# Altium footprint library eLIB.PcbLib: 206 footprints (part 9 of 13)
Each footprint in its own frame and in the unit in brackets; x right, y up, seen from the top. Pads: shape width x height; smd on the part's side, far side on the other; paste and mask are expansions set on the pad; w line width, h text height; cw(c..) or ccw(c..) is an arc to the next point about the centre after c.
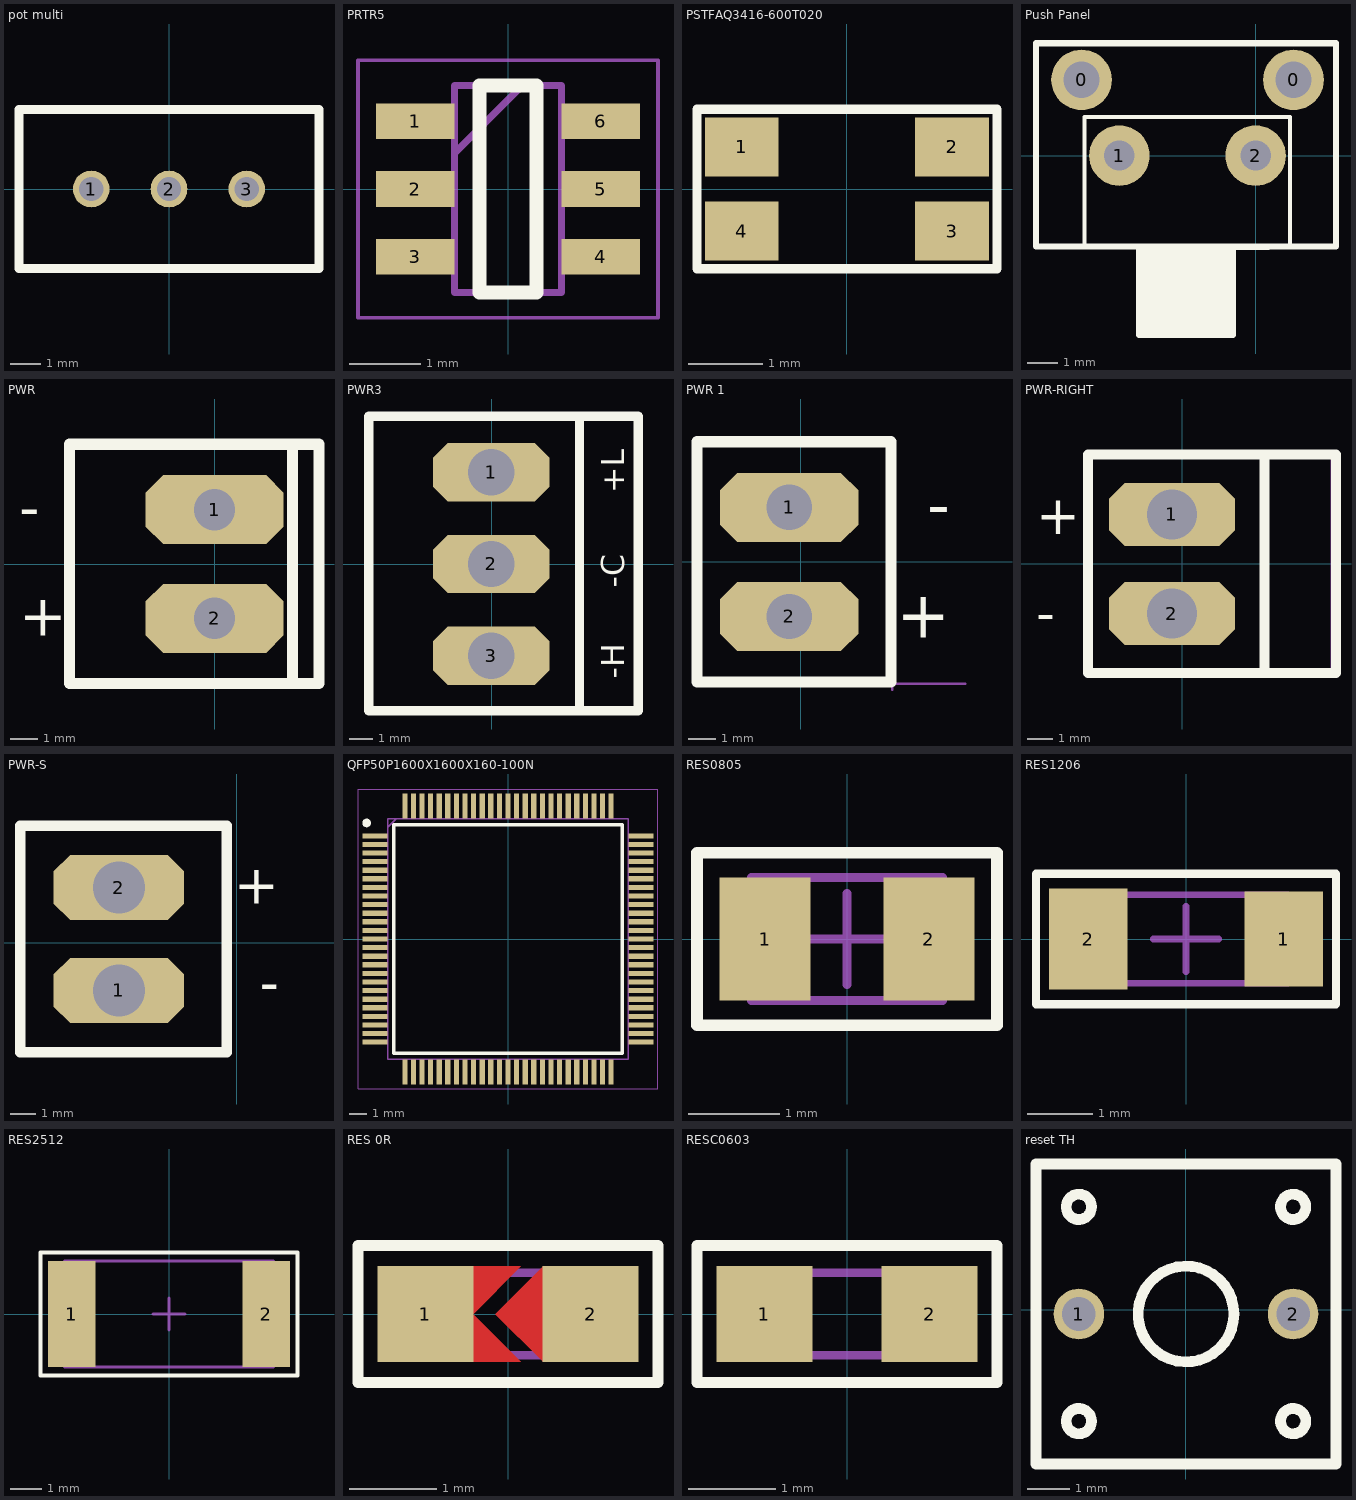
[diagram p8: the footprints below, top view; thin cyan lines are the x and y axes]

## pot multi [mm] "multiturn potentiometer"
pads (3):
  round 1.2 hole 0.8: 1(-2.54,0) 2(0,0) 3(2.54,0)
Top Overlay:
  lines w0.3: -4.9,-2.6 -4.9,2.6 0.19,2.6 4.9,2.6 4.9,-2.6 -0.19,-2.6 -4.9,-2.6
3D body "Trimpot_3296W.STEP": height 11.55, standoff -2.6, extent -4.765,-2.415 4.765,2.415

## PRTR5 [mm] "ESD Protection"
pads (6):
  rect 1.1x0.5 smd: 1(-1.3,0.95) 2(-1.3,0) 3(-1.3,-0.95) 4(1.3,-0.95) 5(1.3,0) 6(1.3,0.95)
Top Overlay:
  lines w0.2: -0.4,-1.45 -0.4,1.45 0.4,1.45 0.4,-1.45 -0.4,-1.45
Mechanical 13:
  lines w0.1: -0.75,0.5 0.2,1.45 ; -0.75,-1.45 -0.75,1.45 0.75,1.45 0.75,-1.45 -0.75,-1.45
Mechanical 15:
  lines w0.05: -2.1,-1.8 -2.1,1.8 2.1,1.8 2.1,-1.8 -2.1,-1.8
3D body "PRTR5V0U4D.stp": height 1, standoff 0, extent -1.375,-1.45 1.375,1.45

## PSTFAQ3416-600T020 [mm] "trans pulse"
pads (4):
  rect 1x0.8 smd: 1(-1.424,0.571) 2(1.424,0.571) 3(1.424,-0.571) 4(-1.424,-0.571)
Top Overlay:
  lines w0.127: -2.03,-1.079 2.034,-1.079 2.034,1.08 -2.03,1.08 -2.03,-1.079

## Push Panel [mm]
pads (4):
  round 2 hole 1.2: 0(-5.75,2.5) 0(1.25,2.5)
  round 2 hole 1: 1(-4.5,0) 2(0,0)
Top Overlay:
  rectangle: -3.848,-5.918 -0.775,-3
  lines w0.127: -5.653,-3 -5.653,1.27 -4.205,1.27 -0.395,1.27 1.129,1.27 1.129,-3 -5.653,-3
  lines w0.203: -3.849,-3.023 -3.849,-5.918 -1.894,-5.918 ; -2.706,-5.918 -0.751,-5.918 -0.751,-3.023 0.418,-3.023 ; 2.653,2.769 2.653,3.708 -7.253,3.708 -7.253,-3 2.653,-3 2.653,3.607
3D body "tact switch.stp": height 7.4, standoff -3.5, extent -6.6,-6.15 2.1,4

## PWR [mil]
pads (2):
  oct 198x99 hole 59.06: 1(0,78) 2(0,-78)
Top Overlay:
  lines w10: -0.39,172 0,171.61
  lines w16: 112.11,-171.06 112.11,172.2 ; 149.91,-171.51 -208.39,-171.51 -208.39,172 150,172 150,-171.26
  text "-" at -280.91,52.21 h60
  text "+" at -280.91,-102.79 h60
Mechanical 13:
  lines w3.94: -210.75,176.43 149.61,176.38 149.61,-174.41 ; -208.39,175.64 -208.39,-174.36 150,-174.41
3D body: height 118.11, standoff 0, extent -208.39,-174.36 150,175.64
3D body: height 295.28, standoff -98.43, extent -27.55,50.45 27.57,105.56
3D body: height 295.28, standoff -98.43, extent -27.55,-105.55 27.57,-50.44

## PWR3 [mil]
pads (3):
  oct 198x99 hole 78.74: 1(-0.83,155.99) 2(-0.81,0.01) 3(-0.81,-155.99)
Top Overlay:
  lines w16: 149.19,-249.6 149.19,250.99 ; 248.7,-249.5 149.1,-249.5 -209.19,-249.5 -209.19,250.99 149.19,250.99 ; 249.19,-249.01 249.19,250.99 149.19,250.99
  text "-H" at 225,-195 h39.37
  text "-C" at 225,-40 h39.37
  text "+L" at 225,120 h39.37
Mechanical 13:
  lines w3.94: -209.19,-252.35 -209.19,250.99 250.81,250.99 250.81,-252.35 -209.19,-252.35
3D body: height 295.28, standoff -98.43, extent -28.36,-183.55 26.76,-128.43
3D body: height 295.28, standoff -98.43, extent -28.36,-27.55 26.76,27.57
3D body: height 118.11, standoff 0, extent -209.19,-252.35 149.19,250.99
3D body: height 393.7, standoff 0, extent 149.19,-257.35 249.19,250.99

## PWR 1 [mil]
pads (2):
  oct 198x99 hole 64.96: 1(-16.61,77.36) 2(-16.61,-78.64)
Top Overlay:
  lines w10: -17.01,171.36 -16.61,170.97
  lines w16: 128.74,-172.05 -148.43,-172.15 -148.43,171.36 128.74,171.26 ; 129.13,-172.15 129.13,170.47
  text "-" at 213.78,49.21 h66.93
  text "+" at 213.78,-109.06 h66.93
Mechanical 13:
  lines w3.94: 130.71,-183.46 130.71,166.54 ; 131.5,175.59 -143.31,175 -143.31,-175 235,-175
3D body: height 118.11, standoff 0, extent -144.09,-175 133.39,175
3D body: height 295.28, standoff -98.43, extent -44.16,49.81 10.95,104.92
3D body: height 295.28, standoff -98.43, extent -44.16,-106.19 10.95,-51.08

## PWR-RIGHT [mil]
pads (2):
  oct 198x99 hole 78.74: 1(-16.61,77.36) 2(-16.61,-78.64)
Top Overlay:
  lines w10: -17.01,171.36 -16.61,170.97
  lines w16: 133.29,-172.15 -148.43,-172.15 -148.43,171.36 133.39,171.36 ; 129.13,-172.15 129.13,171.36 241.34,171.36 241.34,-172.15 129.13,-172.15
  text "-" at -230.31,-107.48 h60
  text "+" at -230.31,46.46 h60
Mechanical 13:
  lines w3.94: -143.31,-175 235,-175 235,175 -143.31,175 -143.31,-175
3D body: height 393.7, standoff 0, extent 133.39,-180 233.39,170
3D body: height 118.11, standoff 0, extent -144.09,-175 133.39,175
3D body: height 295.28, standoff -98.43, extent -44.16,49.81 10.95,104.92
3D body: height 295.28, standoff -98.43, extent -44.16,-106.19 10.95,-51.08

## PWR-S [mil]
pads (2):
  oct 198x99 hole 78.74: 1(-178.39,-72.36) 2(-178.39,83.64)
Top Overlay:
  lines w10: -178.39,-165.97 -177.99,-166.36
  lines w16: -328.39,177.24 -328.39,-166.36 -15,-166.36 -15,177.15 -328.29,177.15
  text "+" at 65,110 h60
  text "-" at 65,-45 h60
Mechanical 13:
  lines w3.94: -330,-170 -330,180 -15,180 -15,-170 -330,-170
3D body: height 295.28, standoff -98.43, extent -205.95,56.08 -150.84,111.19
3D body: height 295.28, standoff -98.43, extent -205.95,-99.92 -150.84,-44.81
3D body: height 118.11, standoff 0, extent -328.39,-170 -15,180

## QFP50P1600X1600X160-100N [mm]
pads (100):
  rect 1.475x0.3 smd: 1(-7.738,6) 2(-7.738,5.5) 3(-7.738,5) 4(-7.738,4.5) 5(-7.738,4) 6(-7.738,3.5) 7(-7.738,3) 8(-7.738,2.5) 9(-7.738,2) 10(-7.738,1.5) 11(-7.738,1) 12(-7.738,0.5) 13(-7.738,0) 14(-7.738,-0.5) 15(-7.738,-1) 16(-7.738,-1.5) 17(-7.738,-2) 18(-7.738,-2.5) 19(-7.738,-3) 20(-7.738,-3.5) 21(-7.738,-4) 22(-7.738,-4.5) 23(-7.738,-5) 24(-7.738,-5.5) 25(-7.738,-6) 51(7.738,-6) 52(7.738,-5.5) 53(7.738,-5) 54(7.738,-4.5) 55(7.738,-4) 56(7.738,-3.5) 57(7.738,-3) 58(7.738,-2.5) 59(7.738,-2) 60(7.738,-1.5) 61(7.738,-1) 62(7.738,-0.5) 63(7.738,0) 64(7.738,0.5) 65(7.738,1) 66(7.738,1.5) 67(7.738,2) 68(7.738,2.5) 69(7.738,3) 70(7.738,3.5) 71(7.738,4) 72(7.738,4.5) 73(7.738,5) 74(7.738,5.5) 75(7.738,6)
  rect 0.3x1.475 smd: 26(-6,-7.738) 27(-5.5,-7.738) 28(-5,-7.738) 29(-4.5,-7.738) 30(-4,-7.738) 31(-3.5,-7.738) 32(-3,-7.738) 33(-2.5,-7.738) 34(-2,-7.738) 35(-1.5,-7.738) 36(-1,-7.738) 37(-0.5,-7.738) 38(0,-7.738) 39(0.5,-7.738) 40(1,-7.738) 41(1.5,-7.738) 42(2,-7.738) 43(2.5,-7.738) 44(3,-7.738) 45(3.5,-7.738) 46(4,-7.738) 47(4.5,-7.738) 48(5,-7.738) 49(5.5,-7.738) 50(6,-7.738) 76(6,7.738) 77(5.5,7.738) 78(5,7.738) 79(4.5,7.738) 80(4,7.738) 81(3.5,7.738) 82(3,7.738) 83(2.5,7.738) 84(2,7.738) 85(1.5,7.738) 86(1,7.738) 87(0.5,7.738) 88(0,7.738) 89(-0.5,7.738) 90(-1,7.738) 91(-1.5,7.738) 92(-2,7.738) 93(-2.5,7.738) 94(-3,7.738) 95(-3.5,7.738) 96(-4,7.738) 97(-4.5,7.738) 98(-5,7.738) 99(-5.5,7.738) 100(-6,7.738)
Top Overlay:
  circle w0.25: c-8.225,6.75 r0.125
  lines w0.2: -6.65,-6.65 6.65,-6.65 6.65,6.65 -6.65,6.65 -6.65,-6.65
Mechanical 13:
  lines w0.1: -7,6.5 -6.5,7 ; -7,-7 7,-7 7,7 -7,7 -7,-7
Mechanical 15:
  lines w0.05: -8.725,-8.725 8.725,-8.725 8.725,8.725 -8.725,8.725 -8.725,-8.725
3D body "STM32F407VGT7.stp": height 1.6, standoff 0, extent -8,-8 8,8

## RES0805 [mm] "Chip Resistor, 2-Leads, Body 2.00x1.25mm, IPC Medium Density"
height 0.6
pads (2):
  rect 1x1.35 smd: 1(-0.9,0) 2(0.9,0)
Top Overlay:
  lines w0.127: -1.65,-0.95 1.65,-0.95 1.65,0.95 -1.65,0.95 -1.65,-0.95
Mechanical 13:
  lines w0.1: -1.05,-0.675 -1.05,0.675 1.05,0.675 1.05,-0.675 -1.05,-0.675
Mechanical 15:
  lines w0.1: -0.5,0 0.5,0 ; 0,-0.5 0,0.5
3D body: height 0.6, standoff 0, extent -0.7,-0.675 0.7,0.675
3D body: height 0.6, standoff 0, extent -1.05,-0.675 -0.7,0.675
3D body: height 0.6, standoff 0, extent 0.7,-0.675 1.05,0.675

## RES1206 [mm]
pads (2):
  rect 1.2x1.45 smd: 1(1.5,0)
  rect 1.2x1.55 smd: 2(-1.5,0)
Top Overlay:
  lines w0.127: -2.3,-1 2.3,-1 2.3,1 -2.3,1 -2.3,-1
Mechanical 13:
  lines w0.1: -1.59,-0.675 1.56,-0.675 1.56,0.675 -1.59,0.675 -1.59,-0.675
Mechanical 15:
  lines w0.1: -0.5,0 0.5,0 ; 0,-0.5 0,0.5
3D body: height 0.6, standoff 0, extent 0.89,-0.675 1.57,0.675
3D body: height 0.6, standoff 0, extent -1.57,-0.675 -0.89,0.675
3D body: height 0.6, standoff 0, extent -0.89,-0.675 0.89,0.675

## RES2512 [mm]
height 0.65
pads (2):
  rect 1.5x3.35 smd: 1(-3.075,0) 2(3.075,0)
Top Overlay:
  lines w0.127: -4.064,-1.95 4.064,-1.95 4.064,1.95 -4.064,1.95 -4.064,-1.95
Mechanical 13:
  lines w0.1: -3.3,-1.675 3.3,-1.675 3.3,1.675 -3.3,1.675 -3.3,-1.675
Mechanical 15:
  lines w0.1: -0.5,0 0.5,0 ; 0,-0.5 0,0.5
3D body "Chip2PinSM127P600-8N.step": height 0.65, standoff 0, extent -3.3,-1.675 3.3,1.675

## RES 0R [mm]
pads (2):
  rect 1.1x1.1 smd: 1(-0.95,0) 2(0.95,0)
Top Layer:
  region: 0.4,-0.55 0.95,0 0.4,0.55 -0.15,0
  region: -0.403,0 0.147,-0.55 -0.403,-0.55
  region: 0.147,0.55 -0.403,0 -0.403,0.55
Top Overlay:
  lines w0.127: -1.727,-0.787 1.727,-0.787 1.727,0.787 -1.727,0.787 -1.727,-0.787
Mechanical 13:
  lines w0.1: -0.85,-0.475 -0.85,0.475 0.85,0.475 0.85,-0.475 -0.85,-0.475
3D body: height 0.6, standoff 0, extent -0.85,-0.475 0.85,0.475

## RESC0603 [mm]
pads (2):
  rect 1.1x1.1 smd: 1(-0.95,0) 2(0.95,0)
Top Overlay:
  lines w0.127: -1.727,-0.787 1.727,-0.787 1.727,0.787 -1.727,0.787 -1.727,-0.787
Mechanical 13:
  lines w0.1: -0.85,-0.475 -0.85,0.475 0.85,0.475 0.85,-0.475 -0.85,-0.475
3D body "User Library-CR1608-0603.STEP": height 0.45, standoff 0, extent -0.8,-0.4 0.8,0.4

## reset TH [mm]
pads (2):
  round 1.2 hole 0.8: 1(-2.54,-0.1) 2(2.54,-0.1)
Top Overlay:
  circle w0.254: c2.54,-2.64 r0.3
  circle w0.254: c2.54,2.44 r0.3
  circle w0.254: c-2.54,-2.64 r0.3
  circle w0.254: c-2.54,2.44 r0.3
  circle w0.254: c0,-0.1 r1.136
  lines w0.254: -3.556,-3.656 -3.556,3.456 3.556,3.456 3.556,-3.656 -3.556,-3.656